# Altium footprint library Cap.PcbLib: 102 footprints (part 6 of 7)
Each footprint in its own frame and in the unit in brackets; x right, y up, seen from the top. Pads: shape width x height; smd on the part's side, far side on the other; paste and mask are expansions set on the pad; w line width, h text height; cw(c..) or ccw(c..) is an arc to the next point about the centre after c.
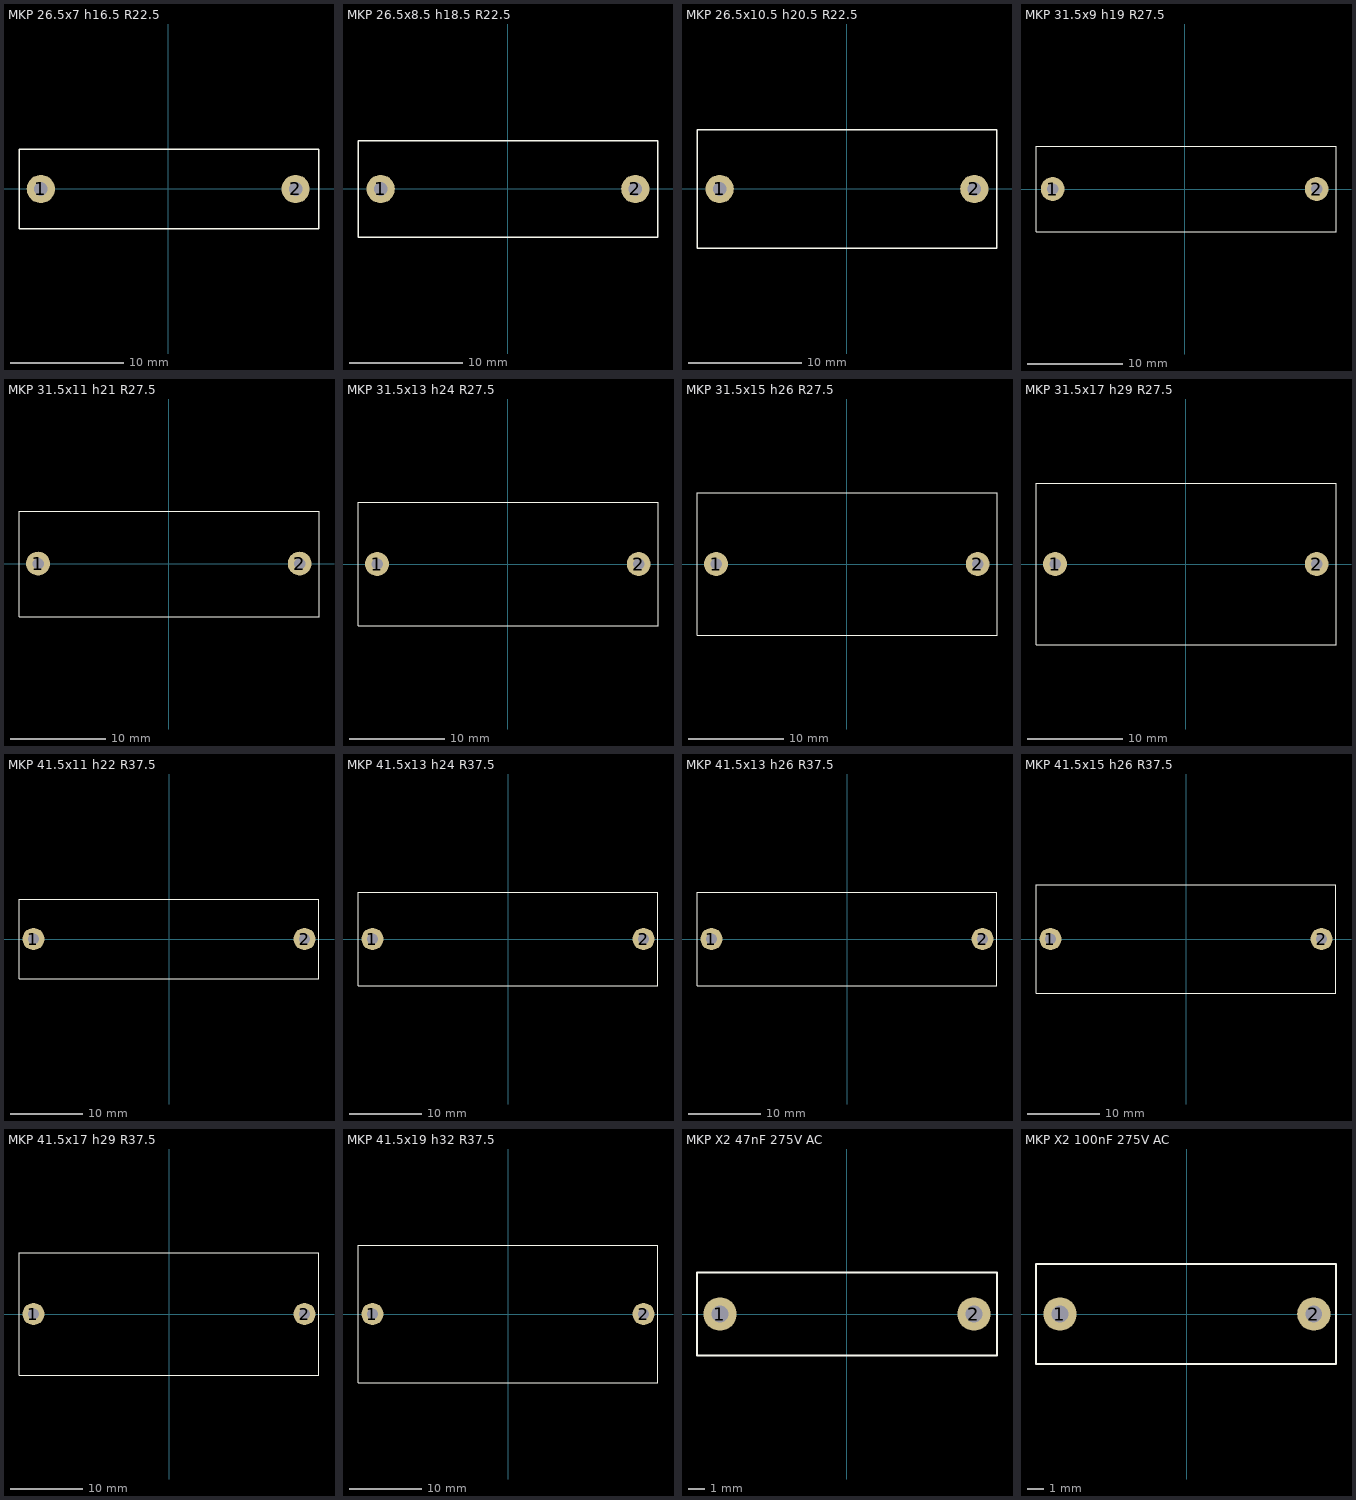
[diagram p5: the footprints below, top view; thin cyan lines are the x and y axes]

## MKP 26.5x7 h16.5 R22.5 [mm]
pads (2):
  round 2.5 hole 1.2: 1(-11.25,0) 2(11.25,0)
TopOverlay:
  lines w0.127: -13.18,-3.5 13.32,-3.5 13.32,3.5 -13.18,3.5 -13.18,-3.5
3D body "MKP 26.5x7 h16.5 R22.5.STEP": height 16.5, standoff -2.54, extent -13.25,-3.5 13.25,3.5

## MKP 26.5x8.5 h18.5 R22.5 [mm]
pads (2):
  round 2.5 hole 1.2: 1(-11.25,0) 2(11.25,0)
TopOverlay:
  lines w0.127: -13.25,-4.25 13.25,-4.25 13.25,4.25 -13.25,4.25 -13.25,-4.25
3D body "MKP 26.5x8.5 h18.5 R22.5.STEP": height 18.5, standoff -2.54, extent -13.25,-4.25 13.25,4.25

## MKP 26.5x10.5 h20.5 R22.5 [mm]
pads (2):
  round 2.5 hole 1.2: 1(-11.25,0) 2(11.25,0)
TopOverlay:
  lines w0.127: -13.25,-5.25 13.25,-5.25 13.25,5.25 -13.25,5.25 -13.25,-5.25
3D body "MKP 26.5x10.5 h20.5 R22.5.STEP": height 20.5, standoff -2.54, extent -13.25,-5.25 13.25,5.25

## MKP 31.5x9 h19 R27.5 [mm]
pads (2):
  round 2.5 hole 1.2: 1(-13.86,0) 2(13.86,0)
TopOverlay:
  lines w0.127: -15.61,-4.5 15.89,-4.5 15.89,4.5 -15.61,4.5 -15.61,-4.5
3D body "MKP 31.5x9 h19 R27.5.STEP": height 19, standoff -2.54, extent -15.64,-4.5 15.86,4.5

## MKP 31.5x11 h21 R27.5 [mm]
pads (2):
  round 2.5 hole 1.2: 1(-13.735,0) 2(13.735,0)
TopOverlay:
  lines w0.127: -15.735,-5.588 -15.735,5.5 15.765,5.5 15.765,-5.588 -15.735,-5.588
3D body "MKP 31.5x11 h21 R27.5.STEP": height 21, standoff -2.54, extent -15.765,-5.5 15.735,5.5

## MKP 31.5x13 h24 R27.5 [mm]
pads (2):
  round 2.5 hole 1.2: 1(-13.735,0) 2(13.735,0)
TopOverlay:
  lines w0.127: -15.735,-6.5 15.765,-6.5 15.765,6.5 -15.735,6.5 -15.735,-6.5
3D body "MKP 31.5x13 h24 R27.5.STEP": height 24, standoff -2.54, extent -15.765,-6.5 15.735,6.5

## MKP 31.5x15 h26 R27.5 [mm]
pads (2):
  round 2.5 hole 1.2: 1(-13.735,0) 2(13.735,0)
TopOverlay:
  lines w0.127: -15.735,-7.5 15.765,-7.5 15.765,7.5 -15.735,7.5 -15.735,-7.5
3D body "MKP 31.5x15 h26 R27.5.STEP": height 26, standoff -2.54, extent -15.735,-7.5 15.765,7.5

## MKP 31.5x17 h29 R27.5 [mm]
pads (2):
  round 2.5 hole 1.2: 1(-13.735,0) 2(13.735,0)
TopOverlay:
  lines w0.127: -15.735,-8.5 15.765,-8.5 15.765,8.5 -15.735,8.5 -15.735,-8.5
3D body "MKP 31.5x17 h29 R27.5.STEP": height 29, standoff -2.54, extent -15.735,-8.5 15.765,8.5

## MKP 41.5x11 h22 R37.5 [mil]
pads (2):
  round 120 hole 60: 1(-738.19,0) 2(738.19,0)
TopOverlay:
  lines w5: -816.93,-216.54 -816.93,216.54 816.93,216.54 816.93,-216.54 -816.93,-216.54
3D body "MKP 41.5x11 h22 R37.5.STEP": height 866.14, standoff -100, extent -816.92,-216.53 816.94,216.54

## MKP 41.5x13 h24 R37.5 [mil]
pads (2):
  round 120 hole 60: 1(-738.19,0) 2(738.19,0)
TopOverlay:
  lines w5: -816.93,-255.91 -816.93,255.91 816.93,255.91 816.93,-255.91 -816.93,-255.91
3D body "MKP 41.5x13 h24 R37.5.STEP": height 944.88, standoff -100, extent -816.92,-255.9 816.94,255.91

## MKP 41.5x13 h26 R37.5 [mil]
pads (2):
  round 120 hole 60: 1(-738.19,0) 2(738.19,0)
TopOverlay:
  lines w5: -816.93,-255.91 816.93,-255.91 816.93,255.91 -816.93,255.91 -816.93,-255.91
3D body "MKP 41.5x13 h26 R37.5.STEP": height 1023.62, standoff -100, extent -816.92,-255.9 816.94,255.91

## MKP 41.5x15 h26 R37.5 [mil]
pads (2):
  round 120 hole 60: 1(-738.19,0) 2(738.19,0)
TopOverlay:
  lines w5: -816.93,-295.28 -816.93,295.28 816.93,295.28 816.93,-295.28 -816.93,-295.28
3D body "MKP 41.5x15 h26 R37.5.STEP": height 1023.62, standoff -100, extent -816.92,-295.27 816.94,295.28

## MKP 41.5x17 h29 R37.5 [mil]
pads (2):
  round 120 hole 60: 1(-738.19,0) 2(738.19,0)
TopOverlay:
  lines w5: -816.93,-334.65 816.93,-334.65 816.93,334.65 -816.93,334.65 -816.93,-334.65
3D body "MKP 41.5x17 h29 R37.5.STEP": height 1141.73, standoff -100, extent -816.92,-334.64 816.94,334.65

## MKP 41.5x19 h32 R37.5 [mil]
pads (2):
  round 120 hole 60: 1(-738.19,0) 2(738.19,0)
TopOverlay:
  lines w5: -816.93,-374.01 -816.93,374.02 816.93,374.02 816.93,-374.01 -816.93,-374.01
3D body "MKP 41.5x19 h32 R37.5.STEP": height 1259.84, standoff -100, extent -816.92,-374.01 816.94,374.02

## MKP X2 47nF 275V AC [mm]
pads (2):
  round 2 hole 1: 1(-7.62,0) 2(7.62,0)
TopOverlay:
  lines w0.127: -9,-2.5 -9,2.5 9,2.5 9,-2.5 -9,-2.5
3D body "MKP X2 47nF 275V AC.STEP": height 11, standoff -2.54, extent -9,-2.5 9,2.5

## MKP X2 100nF 275V AC [mm]
pads (2):
  round 2 hole 1: 1(-7.62,0) 2(7.62,0)
TopOverlay:
  lines w0.127: -9.06,-3 -9.06,3 8.95,3 8.95,-3 -9.06,-3
3D body "MKP X2 100nF 275V AC.STEP": height 12, standoff -2.54, extent -9,-3 9,3